# Altium footprint library Mylib.PcbLib: 320 footprints (part 6 of 20)
Each footprint in its own frame and in the unit in brackets; x right, y up, seen from the top. Pads: shape width x height; smd on the part's side, far side on the other; paste and mask are expansions set on the pad; w line width, h text height; cw(c..) or ccw(c..) is an arc to the next point about the centre after c.
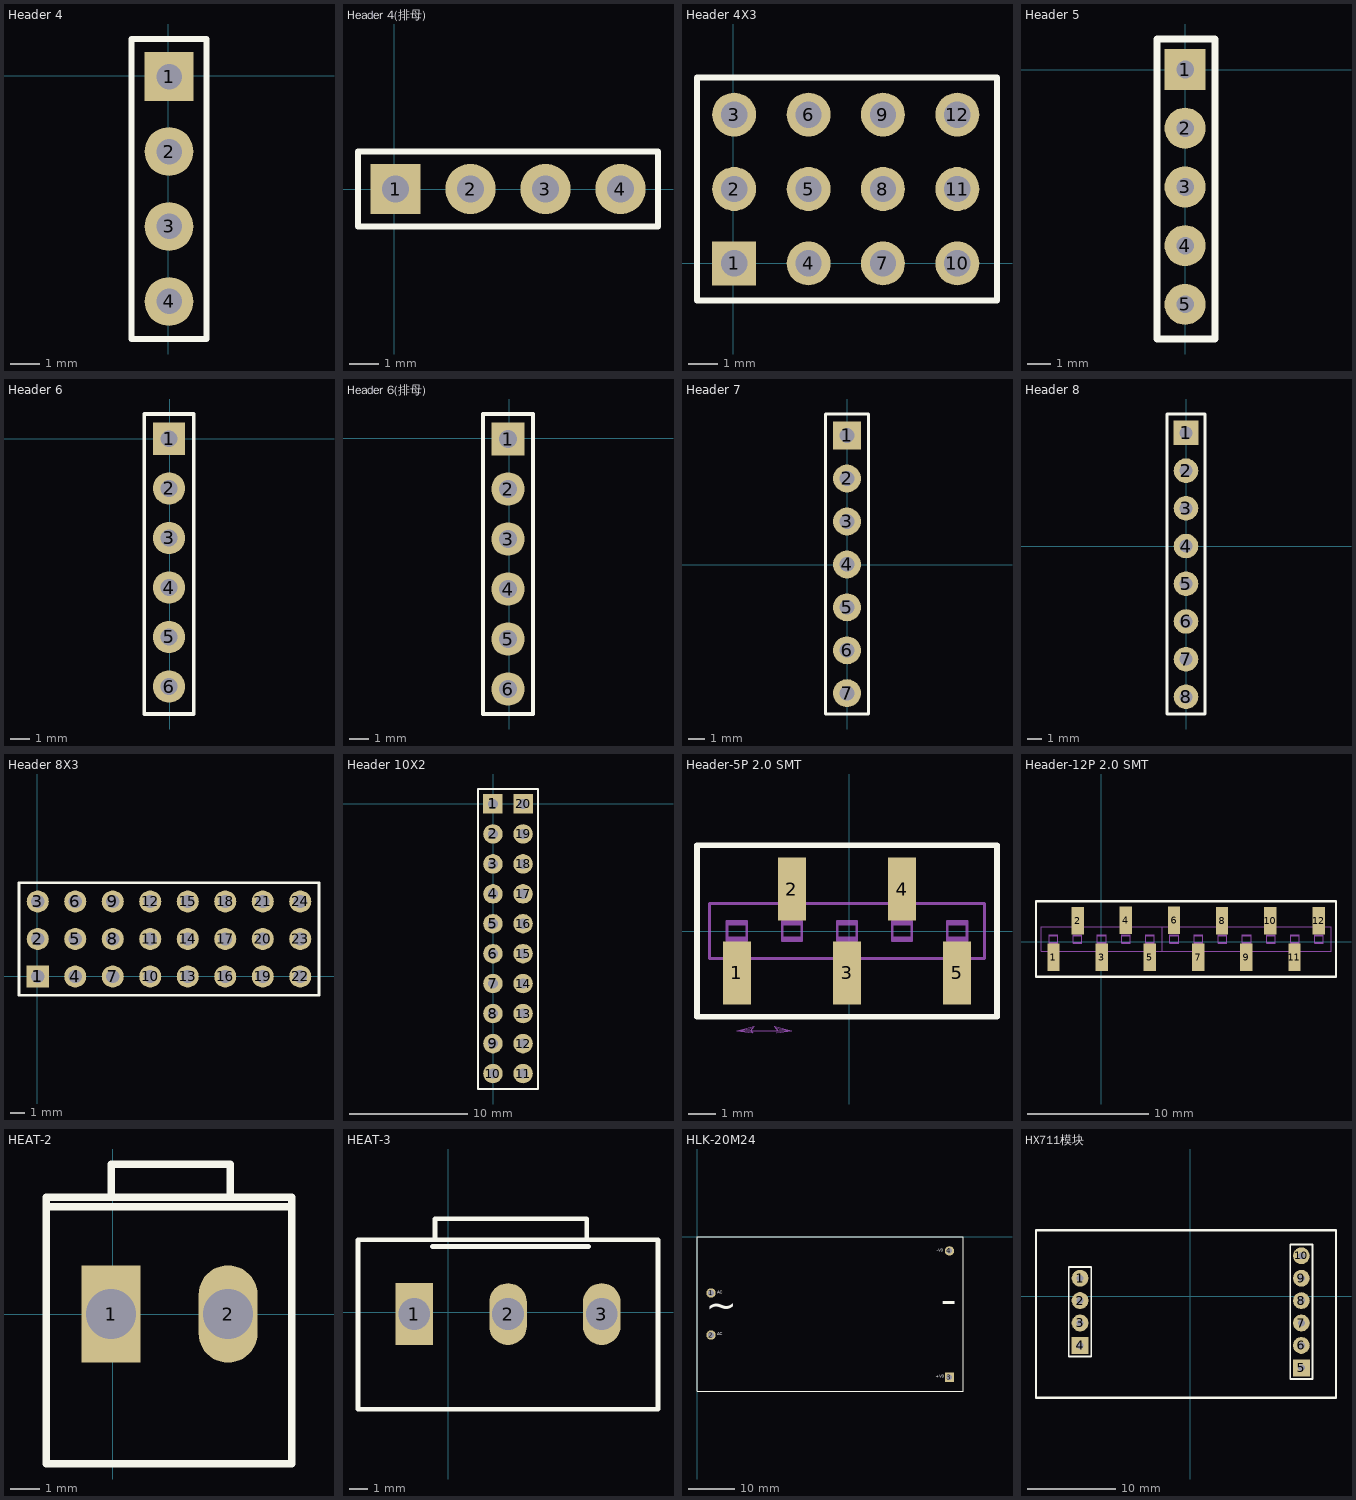
[diagram p5: the footprints below, top view; thin cyan lines are the x and y axes]

## Header 4 [mil]
pads (4):
  rect 65x65 hole 34: 1(0.95,-0.93)
  round 65 hole 34: 2(0.95,-100.93) 3(0.95,-200.93) 4(0.95,-300.93)
Top Overlay:
  lines w7.87: -49.05,-350.93 50.95,-350.93 50.95,49.07 -49.05,49.07 -49.05,-350.93
3D body "HDR1X4_2.54mm.STEP": height 336.22, standoff -118.11, extent -51.18,-353.54 48.82,46.46

## Header 4(排母) [mm]
pads (4):
  rect 1.7x1.7 hole 0.9: 1(0.035,0.015)
  round 1.7 hole 0.9: 2(2.575,0.015) 3(5.115,0.015) 4(7.655,0.015)
Top Overlay:
  lines w0.2: -1.235,-1.255 8.925,-1.255 8.925,1.285 -1.235,1.285 -1.235,-1.255
3D body "HDR2.54-1P_M.STEP": height 8.5, standoff -3, extent 3.845,-1.255 6.385,1.285
3D body "HDR2.54-1P_M.STEP": height 8.5, standoff -3, extent 6.385,-1.255 8.925,1.285
3D body "HDR2.54-1P_M.STEP": height 8.5, standoff -3, extent -1.235,-1.255 1.305,1.285
3D body "HDR2.54-1P_M.STEP": height 8.5, standoff -3, extent 1.305,-1.255 3.845,1.285

## Header 4X3 [mm]
pads (12):
  rect 1.5x1.5 hole 0.9: 1(0.025,0)
  round 1.5 hole 0.9: 2(0.025,2.54) 3(0.025,5.08) 4(2.565,0) 5(2.565,2.54) 6(2.565,5.08) 7(5.105,0) 8(5.105,2.54) 9(5.105,5.08) 10(7.645,0) 11(7.645,2.54) 12(7.645,5.08)
Top Overlay:
  lines w0.2: -1.245,6.299 -1.245,-1.27 9,-1.27 9,6.35 -1.245,6.35
3D body "HEADER.STEP": height 7.58, standoff -2.94, extent 6.375,3.81 8.915,6.35
3D body "HEADER.STEP": height 7.58, standoff -2.94, extent 3.835,3.81 6.375,6.35
3D body "HEADER.STEP": height 7.58, standoff -2.94, extent 1.295,3.81 3.835,6.35
3D body "HEADER.STEP": height 7.58, standoff -2.94, extent -1.245,3.81 1.295,6.35
3D body "HEADER.STEP": height 7.58, standoff -2.94, extent -1.245,-1.27 1.295,1.27
3D body "HEADER.STEP": height 7.58, standoff -2.94, extent -1.245,1.27 1.295,3.81
3D body "HEADER.STEP": height 7.58, standoff -2.94, extent 1.295,-1.27 3.835,1.27
3D body "HEADER.STEP": height 7.58, standoff -2.94, extent 1.295,1.27 3.835,3.81
3D body "HEADER.STEP": height 7.58, standoff -2.94, extent 3.835,-1.27 6.375,1.27
3D body "HEADER.STEP": height 7.58, standoff -2.94, extent 3.835,1.27 6.375,3.81
3D body "HEADER.STEP": height 7.58, standoff -2.94, extent 6.375,-1.27 8.915,1.27
3D body "HEADER.STEP": height 7.58, standoff -2.94, extent 6.375,1.27 8.915,3.81

## Header 5 [mil]
pads (5):
  rect 70x70 hole 30: 1(0,0)
  round 70 hole 30: 2(0,-100) 3(0,-200) 4(0,-300) 5(0,-400)
Top Overlay:
  lines w12: -48,-459 -48,52 51,52 51,-459 -48,-459
3D body: height 336.22, standoff -118.11, extent -51,-450 49,50

## Header 6 [mil]
pads (6):
  rect 65x65 hole 34: 1(-1.02,0.06)
  round 65 hole 34: 2(-1.02,-99.94) 3(-1.02,-199.94) 4(-1.02,-299.94) 5(-1.02,-399.75) 6(-1.02,-499.75)
Top Overlay:
  lines w7.87: -51.02,-555.12 -51.02,50.06 48.98,50.06 48.98,-555.12 -51.02,-555.12
3D body "HDR1X6_2.54mm.STEP": height 336.22, standoff -118.11, extent -50,-553.74 50,46.26

## Header 6(排母) [mm]
pads (6):
  rect 1.7x1.7 hole 0.9: 1(-0.06,-0.04)
  round 1.7 hole 0.9: 2(-0.06,-2.58) 3(-0.06,-5.12) 4(-0.06,-7.66) 5(-0.06,-10.2) 6(-0.06,-12.74)
Top Overlay:
  lines w0.2: -1.33,-14.01 -1.33,1.23 1.21,1.23 1.21,-14.01 -1.33,-14.01
3D body "HDR2.54-1P_M.STEP": height 8.5, standoff -3, extent -1.33,-11.47 1.21,-8.93
3D body "HDR2.54-1P_M.STEP": height 8.5, standoff -3, extent -1.33,-8.93 1.21,-6.39
3D body "HDR2.54-1P_M.STEP": height 8.5, standoff -3, extent -1.33,-14.01 1.21,-11.47
3D body "HDR2.54-1P_M.STEP": height 8.5, standoff -3, extent -1.33,-3.85 1.21,-1.31
3D body "HDR2.54-1P_M.STEP": height 8.5, standoff -3, extent -1.33,-1.31 1.21,1.23
3D body "HDR2.54-1P_M.STEP": height 8.5, standoff -3, extent -1.33,-6.39 1.21,-3.85

## Header 7 [mil]
pads (7):
  rect 65x65 hole 34: 1(0,301)
  round 65 hole 34: 2(0,201) 3(0,101) 4(0,1) 5(0,-98.8) 6(0,-198.8)
  round 65 hole 34 paste+0: 7(0,-298.61)
Top Overlay:
  lines w7.87: -50,-347 -50,351 50,351 50,-347 -49,-347
3D body: height 336.22, standoff -118.11, extent -50,-348.61 50,351.39

## Header 8 [mil]
pads (8):
  rect 65x65 hole 34: 1(0,300)
  round 65 hole 34: 2(0,200) 3(0,100) 4(0,0) 5(0,-99.8) 6(0,-199.8) 8(0,-399.61)
  round 65 hole 34 paste+0: 7(0,-299.61)
Top Overlay:
  lines w7.87: -50,-445 -50,350 50,350 50,-445 -50,-445
3D body "HDR1X8_2.54mm.STEP": height 336.22, standoff -118.11, extent -49,-451 51,349

## Header 8X3 [mm]
pads (24):
  rect 1.5x1.5 hole 0.9: 1(0.025,0)
  round 1.5 hole 0.9: 2(0.025,2.54) 3(0.025,5.08) 4(2.565,0) 5(2.565,2.54) 6(2.565,5.08) 7(5.105,0) 8(5.105,2.54) 9(5.105,5.08) 10(7.645,0) 11(7.645,2.54) 12(7.645,5.08) 13(10.185,0) 14(10.185,2.54) 15(10.185,5.08) 16(12.725,0) 17(12.725,2.54) 18(12.725,5.08) 19(15.265,0) 20(15.265,2.54) 21(15.265,5.08) 22(17.805,0) 23(17.805,2.54) 24(17.805,5.08)
Top Overlay:
  lines w0.2: -1.245,6.299 -1.245,-1.27 19.075,-1.27 19.075,6.299 ; -1.245,6.35 19.075,6.35
3D body "HEADER.STEP": height 7.58, standoff -2.94, extent 16.535,1.27 19.075,3.81
3D body "HEADER.STEP": height 7.58, standoff -2.94, extent 16.535,-1.27 19.075,1.27
3D body "HEADER.STEP": height 7.58, standoff -2.94, extent 13.995,1.27 16.535,3.81
3D body "HEADER.STEP": height 7.58, standoff -2.94, extent 13.995,-1.27 16.535,1.27
3D body "HEADER.STEP": height 7.58, standoff -2.94, extent 11.455,1.27 13.995,3.81
3D body "HEADER.STEP": height 7.58, standoff -2.94, extent 11.455,-1.27 13.995,1.27
3D body "HEADER.STEP": height 7.58, standoff -2.94, extent 8.915,1.27 11.455,3.81
3D body "HEADER.STEP": height 7.58, standoff -2.94, extent 8.915,-1.27 11.455,1.27
3D body "HEADER.STEP": height 7.58, standoff -2.94, extent 6.375,1.27 8.915,3.81
3D body "HEADER.STEP": height 7.58, standoff -2.94, extent 6.375,-1.27 8.915,1.27
3D body "HEADER.STEP": height 7.58, standoff -2.94, extent 3.835,1.27 6.375,3.81
3D body "HEADER.STEP": height 7.58, standoff -2.94, extent 3.835,-1.27 6.375,1.27
3D body "HEADER.STEP": height 7.58, standoff -2.94, extent 1.295,1.27 3.835,3.81
3D body "HEADER.STEP": height 7.58, standoff -2.94, extent 1.295,-1.27 3.835,1.27
3D body "HEADER.STEP": height 7.58, standoff -2.94, extent -1.245,1.27 1.295,3.81
3D body "HEADER.STEP": height 7.58, standoff -2.94, extent -1.245,-1.27 1.295,1.27
3D body "HEADER.STEP": height 7.58, standoff -2.94, extent -1.245,3.81 1.295,6.35
3D body "HEADER.STEP": height 7.58, standoff -2.94, extent 1.295,3.81 3.835,6.35
3D body "HEADER.STEP": height 7.58, standoff -2.94, extent 3.835,3.81 6.375,6.35
3D body "HEADER.STEP": height 7.58, standoff -2.94, extent 6.375,3.81 8.915,6.35
3D body "HEADER.STEP": height 7.58, standoff -2.94, extent 8.915,3.81 11.455,6.35
3D body "HEADER.STEP": height 7.58, standoff -2.94, extent 11.455,3.81 13.995,6.35
3D body "HEADER.STEP": height 7.58, standoff -2.94, extent 13.995,3.81 16.535,6.35
3D body "HEADER.STEP": height 7.58, standoff -2.94, extent 16.535,3.81 19.075,6.35

## Header 10X2 [mil]
pads (20):
  rect 65x65 hole 34: 1(-0.98,-0.2) 20(99.41,-0.2)
  round 65 hole 34: 2(-0.98,-100.2) 3(-0.98,-200.2) 4(-0.98,-300.2) 5(-0.98,-400) 6(-0.98,-500) 8(-0.98,-699.8) 10(-0.98,-900.2) 11(99.41,-900.2) 13(99.41,-699.8) 15(99.41,-500) 16(99.41,-400) 17(99.41,-300.2) 18(99.41,-200.2) 19(99.41,-100.2)
  round 65 hole 34 paste+0: 7(-0.98,-599.8) 9(-0.98,-800.2) 12(99.41,-800.2) 14(99.41,-599.8)
Top Overlay:
  lines w7.87: 49.02,-951.77 -50.98,-951.77 -50.98,49.8 49.02,49.8 ; 49.41,-951.77 149.41,-951.77 149.41,49.8 49.41,49.8
3D body "HDR-1x2_H.STEP": height 200.79, standoff -118.11, extent -13.19,-347.83 492.72,-247.83
3D body "HDR-1x2_H.STEP": height 200.79, standoff -118.11, extent -13.19,-447.83 492.72,-347.83
3D body "HDR-1x2_H.STEP": height 200.79, standoff -118.11, extent -13.19,-147.83 492.72,-47.83
3D body "HDR-1x2_H.STEP": height 200.79, standoff -118.11, extent -13.19,-247.83 492.72,-147.83
3D body "HDR-1x2_H.STEP": height 200.79, standoff -118.11, extent -13.19,-47.83 492.72,52.17
3D body "HDR-1x2_H.STEP": height 200.79, standoff -118.11, extent -13.19,-847.83 492.72,-747.83
3D body "HDR-1x2_H.STEP": height 200.79, standoff -118.11, extent -13.19,-947.83 492.72,-847.83
3D body "HDR-1x2_H.STEP": height 200.79, standoff -118.11, extent -13.19,-647.83 492.72,-547.83
3D body "HDR-1x2_H.STEP": height 200.79, standoff -118.11, extent -13.19,-747.83 492.72,-647.83
3D body "HDR-1x2_H.STEP": height 200.79, standoff -118.11, extent -13.19,-547.83 492.72,-447.83

## Header-5P 2.0 SMT [mil] "贴片单排"
pads (5):
  rect 40.16x90.16 smd mask+0: 1(-160.48,-60) 2(-81.74,60) 3(-3,-60) 4(75.74,60) 5(154.48,-60)
Top Overlay:
  lines w7.87: -217.53,-122.84 -217.53,122.84 211.53,122.84 211.53,-122.84 -217.53,-122.84
Top Paste:
  region: 134.4,-105.08 134.4,-14.92 174.56,-14.92 174.56,-105.08
  region: 55.66,14.92 55.66,105.08 95.82,105.08 95.82,14.92
  region: -23.08,-105.08 -23.08,-14.92 17.08,-14.92 17.08,-105.08
  region: -101.82,14.92 -101.82,105.08 -61.66,105.08 -61.66,14.92
  region: -180.56,-105.08 -180.56,-14.92 -140.4,-14.92 -140.4,-105.08
Top Solder:
  region: 132.39,-107.09 132.39,-12.91 176.57,-12.91 176.57,-107.09
  region: 53.65,12.91 53.65,107.09 97.83,107.09 97.83,12.91
  region: -25.09,-107.09 -25.09,-12.91 19.09,-12.91 19.09,-107.09
  region: -103.83,12.91 -103.83,107.09 -59.65,107.09 -59.65,12.91
  region: -182.57,-107.09 -182.57,-12.91 -138.39,-12.91 -138.39,-107.09
Mechanical 3:
  lines w3.94: -174.5,-10 -146.47,-10 ; -174.5,10 -146.47,10 ; -170.48,-39.33 -170.48,-85 -150.48,-85 -150.48,-39.33 ; -121.15,-39.33 -199.81,-39.33 -199.81,39.33 -121.15,39.33 ; -121.07,-39.33 -42.41,-39.33 ; -121.07,39.33 -42.41,39.33 ; -95.76,-10 -67.72,-10 ; -95.76,10 -67.72,10 ; -91.74,39.33 -91.74,85 -71.74,85 -71.74,39.33 ; -42.33,-39.33 36.33,-39.33 ; -42.33,39.33 36.33,39.33 ; -17.02,-10 11.02,-10 ; -17.02,10 11.02,10 ; -13,-39.33 -13,-85 7,-85 7,-39.33 ; 36.41,-39.33 115.07,-39.33 ; 36.41,39.33 115.07,39.33 ; 61.72,-10 89.76,-10 ; 61.72,10 89.76,10 ; 65.74,39.33 65.74,85 85.74,85 85.74,39.33 ; 115.15,-39.33 193.81,-39.33 193.81,39.33 115.15,39.33 ; 140.47,-10 168.5,-10 ; 140.47,10 168.5,10 ; 144.48,-39.33 144.48,-85 164.48,-85 164.48,-39.33 ; -174.5,-14.02 -146.47,-14.02 -146.47,14.02 -174.5,14.02 -174.5,-14.02 ; -95.76,-14.02 -67.72,-14.02 -67.72,14.02 -95.76,14.02 -95.76,-14.02 ; -17.02,-14.02 11.02,-14.02 11.02,14.02 -17.02,14.02 -17.02,-14.02 ; 61.72,-14.02 89.76,-14.02 89.76,14.02 61.72,14.02 61.72,-14.02 ; 140.47,-14.02 140.47,14.02 168.5,14.02 168.5,-14.02 140.47,-14.02
Mechanical 30:
  lines w0: -104.22,-145.63 -81.74,-142.52 ; -160.48,-142.52 -81.74,-142.52 ; -160.48,-142.52 -137.96,-139.37 -135.48,-136.26 ; -160.48,-142.52 -140.48,-142.52 ; -160.48,-142.52 -137.96,-145.63 -140.48,-142.52 ; -160.48,-142.52 -135.48,-136.26 ; -140.48,-142.52 -135.48,-136.26 ; -101.74,-142.52 -81.74,-142.52 ; -101.74,-142.52 -104.22,-139.37 -81.74,-142.52 ; -101.74,-142.52 -106.74,-136.26 -81.74,-142.52
Mechanical 32:
  lines w3.94: -217.53,-122.84 211.53,-122.84 211.53,122.84 -217.53,122.84 -217.53,-122.84

## Header-12P 2.0 SMT [mil]
pads (12):
  rect 40.16x90.16 smd mask+0: 1(-155.48,-51) 2(-76.74,69) 3(2,-51) 4(80.26,70) 5(159,-50) 6(237.74,70) 7(316.48,-50) 8(394.26,69) 9(473,-51) 10(551.74,69) 11(630.48,-51) 12(709.74,69)
Top Overlay:
  lines w7.87: -212.53,-113.84 766,-113.84 766,131.84 -212.53,131.84 -212.53,-113.84
Top Paste:
  region: -175.56,-96.08 -175.56,-5.92 -135.4,-5.92 -135.4,-96.08
  region: -96.82,23.92 -96.82,114.08 -56.66,114.08 -56.66,23.92
  region: -18.08,-96.08 -18.08,-5.92 22.08,-5.92 22.08,-96.08
  region: 60.66,23.92 60.66,114.08 100.82,114.08 100.82,23.92
  region: 139.4,-96.08 139.4,-5.92 179.56,-5.92 179.56,-96.08
  region: 296.4,-95.08 296.4,-4.92 336.56,-4.92 336.56,-95.08
  region: 531.66,23.92 531.66,114.08 571.82,114.08 571.82,23.92
  region: 452.92,-96.08 452.92,-5.92 493.08,-5.92 493.08,-96.08
  region: 373.92,24 373.92,114.16 414.08,114.16 414.08,24
  region: 217.84,25 217.84,115.16 258,115.16 258,25
  region: 610.92,-96.08 610.92,-5.92 651.08,-5.92 651.08,-96.08
  region: 689.66,23.92 689.66,114.08 729.82,114.08 729.82,23.92
Top Solder:
  region: -177.57,-98.09 -177.57,-3.91 -133.39,-3.91 -133.39,-98.09
  region: -98.83,21.91 -98.83,116.09 -54.65,116.09 -54.65,21.91
  region: -20.09,-98.09 -20.09,-3.91 24.09,-3.91 24.09,-98.09
  region: 58.65,21.91 58.65,116.09 102.83,116.09 102.83,21.91
  region: 137.39,-98.09 137.39,-3.91 181.57,-3.91 181.57,-98.09
  region: 294.39,-97.09 294.39,-2.91 338.57,-2.91 338.57,-97.09
  region: 608.39,-98.09 608.39,-3.91 652.57,-3.91 652.57,-98.09
  region: 529.65,21.91 529.65,116.09 573.83,116.09 573.83,21.91
  region: 450.91,-98.09 450.91,-3.91 495.09,-3.91 495.09,-98.09
  region: 371.82,22 371.82,116.18 416,116.18 416,22
  region: 215.91,22 215.91,116.18 260.09,116.18 260.09,22
  region: 687.65,21.91 687.65,116.09 731.83,116.09 731.83,21.91
Mechanical 3:
  drawing of 156 lines, arcs and shapes, not listed

## HEAT-2 [mm]
pads (2):
  rect 2x3.3 hole 1.7: 1(-0.051,0.007)
  oval 2x3.3 hole 1.7: 2(3.909,0.007)
Top Overlay:
  lines w0.254: -2.251,3.639 6.069,3.639 ; -0.051,3.967 -0.051,5.087 3.988,5.087 3.988,3.967 ; -2.251,-5.073 -2.251,3.967 6.069,3.967 6.069,-5.073 -2.251,-5.073
3D body "molex-22-27-2021.STEP": height 11.68, standoff -3.56, extent -0.47,-3.57 4.61,2.78

## HEAT-3 [mm]
pads (3):
  rect 2x3.3 hole 1.7: 1(-1.8,-0.1)
  oval 2x3.3 hole 1.7: 2(3.2,-0.1) 3(8.2,-0.1)
Top Overlay:
  lines w0.254: -0.82,3.5 7.5,3.5 ; -0.7,3.867 -0.7,4.987 2.359,4.987 4.378,4.987 7.4,4.987 7.4,3.867 ; -4.8,-5.173 11.2,-5.173 11.2,3.867 -4.8,3.867 -4.8,-5.173
3D body "molex-22-27-2031.STEP": height 11.68, standoff -3.56, extent -0.457,-3.734 7.163,2.616

## HLK-20M24 [mm] "HILINK 24V隔离电源模块"
pads (4):
  round 2 hole 1.2: 1(3,-12) 2(3,-21) 4(54,-3)
  rect 2x2 hole 1.2: 3(54,-30)
Top Overlay:
  lines w0.1: 0,-33 0,0 57,0 57,-33 0,-33
  text "-V0" at 51.317,-3.4 h1.02
  text "+V0" at 51.075,-30.4 h1.02
  text "AC" at 4.375,-21.275 h1.02
  text "AC" at 4.375,-12.35 h1.02
  text "~" at 1.925,-19.35 h10
  text "-" at 52.175,-18.856 h12
3D body "20M4_3.step": height 22.6, standoff -6, extent 0,-33 57,0

## HX711模块 [mil]
pads (10):
  round 75 hole 30: 1(-492.49,81.19) 2(-492.49,-18.81) 3(-492.49,-118.81) 6(495.26,-219) 7(495.26,-119) 8(495.26,-19) 9(495.26,81) 10(495.26,181)
  rect 75x75 hole 30: 4(-492.49,-218.81) 5(495.26,-319)
Top Overlay:
  lines w7.87: -542.49,-268.81 -542.49,131.19 -442.49,131.19 -442.49,-268.81 -542.49,-268.81 ; 445.26,-369 445.26,231 545.26,231 545.26,-369 445.26,-369
  lines w10: -688.98,-452.76 -688.98,295.28 649.61,295.28 649.61,-452.76 -688.98,-452.76
3D body: height 340, standoff 300, extent -669.29,-433.07 629.92,275.59
3D body: height 336.22, standoff -118.11, extent -540.94,-262.99 -440.94,137.01
3D body: height 336.22, standoff -118.11, extent 445.26,-368.99 545.26,231.01